# Altium footprint library 3.22-杂项.PcbLib: 985 footprints (part 26 of 64)
Each footprint in its own frame and in the unit in brackets; x right, y up, seen from the top. Pads: shape width x height; smd on the part's side, far side on the other; paste and mask are expansions set on the pad; w line width, h text height; cw(c..) or ccw(c..) is an arc to the next point about the centre after c.
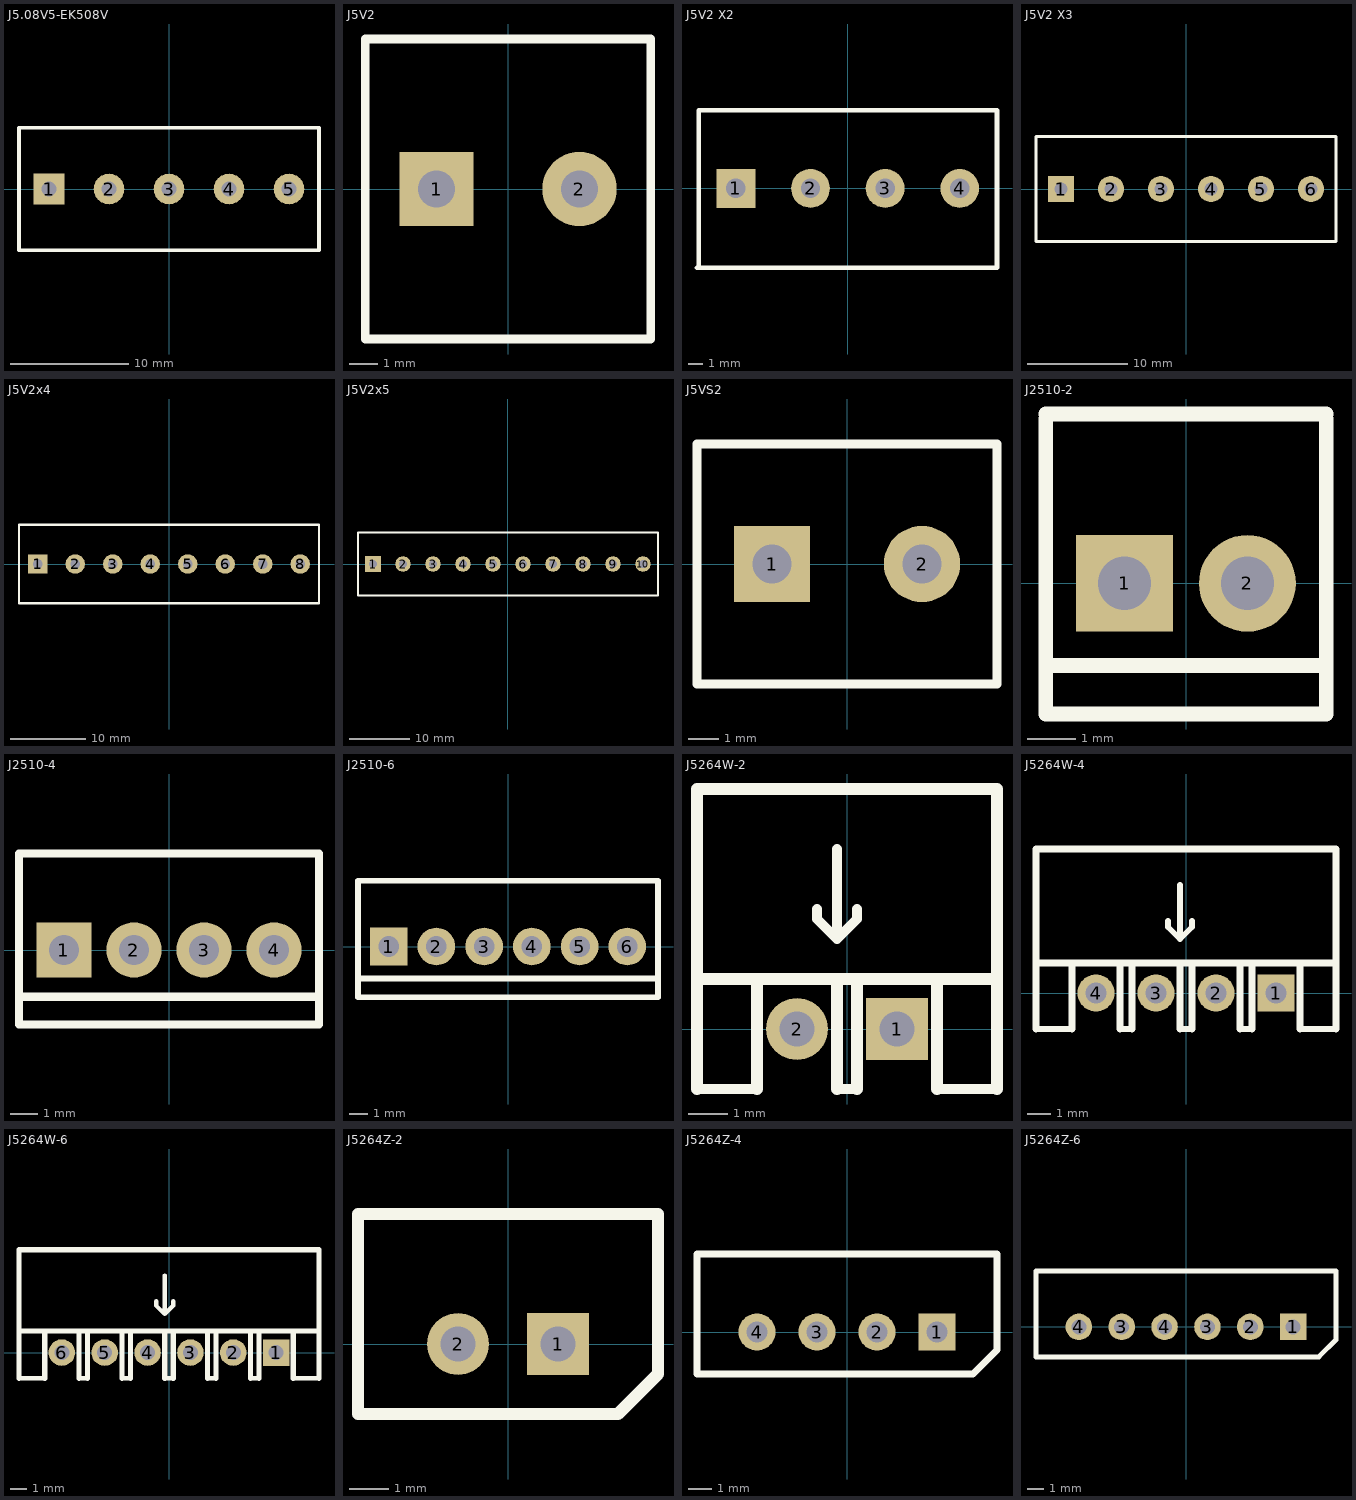
[diagram p25: the footprints below, top view; thin cyan lines are the x and y axes]

## J5.08V5-EK508V [mm] "由2芯和3芯拼接起来的"
pads (5):
  rect 2.6x2.6 hole 1.3: 1(-10.16,0)
  round 2.6 hole 1.3: 2(-5.08,0) 3(0,0) 4(5.08,0) 5(10.16,0)
Top Overlay:
  lines w0.305: -12.7,-5.2 -12.7,5.2 12.7,5.2 12.7,-5.2 -12.7,-5.2

## J5V2 [mm] "5mm间距2芯方针，直径1.3mm，垂直方向一字镙丝,宽10.5mm"
height 14.2
pads (2):
  rect 2.6x2.6 hole 1.3: 1(-2.5,0)
  round 2.6 hole 1.3: 2(2.5,0)
Top Overlay:
  lines w0.305: -5,-5.25 -5,5.25 5,5.25 5,-5.25 -5,-5.25

## J5V2 X2 [mm] "5mm间距2芯方针，直径1.3mm，垂直方向一字镙丝,宽10.5mm"
pads (4):
  rect 2.6x2.6 hole 1.3: 1(-7.5,0)
  round 2.6 hole 1.3: 2(-2.5,0) 3(2.5,0) 4(7.5,0)
Top Overlay:
  lines w0.305: -10.108,-5.334 10,-5.334 ; -10,-5.25 -10,5.25 10,5.25 10,-5.25

## J5V2 X3 [mm] "3个J5V2组成：5mm间距2芯方针，直径1.3mm，垂直方向一字镙丝,宽10.5mm"
pads (6):
  rect 2.6x2.6 hole 1.3: 1(-12.5,0)
  round 2.6 hole 1.3: 2(-7.5,0) 3(-2.5,0) 4(2.5,0) 5(7.5,0) 6(12.5,0)
Top Overlay:
  lines w0.305: -15,-5.25 15,-5.25 15,5.25 -15,5.25 -15,-5.25

## J5V2x4 [mm] "4个J5V2组成：5mm间距2芯方针，直径1.3mm，垂直方向一字镙丝,宽10.5mm"
height 14.2
pads (8):
  rect 2.6x2.6 hole 1.3: 1(-17.5,0)
  round 2.6 hole 1.3: 2(-12.5,0) 3(-7.5,0) 4(-2.5,0) 5(2.5,0) 6(7.5,0) 7(12.5,0) 8(17.5,0)
Top Overlay:
  lines w0.305: -20,-5.25 -20,5.25 20,5.25 20,-5.25 -20,-5.25

## J5V2x5 [mm] "5个J5V2组成：5mm间距2芯方针，直径1.3mm，垂直方向一字镙丝,宽10.5mm"
height 14.2
pads (10):
  rect 2.6x2.6 hole 1.3: 1(-22.5,0)
  round 2.6 hole 1.3: 2(-17.5,0) 3(-12.5,0) 4(-7.5,0) 5(-2.5,0) 6(2.5,0) 7(7.5,0) 8(12.5,0) 9(17.5,0) 10(22.5,0)
Top Overlay:
  lines w0.305: -25,-5.25 25,-5.25 25,5.25 -25,5.25 -25,-5.25

## J5VS2 [mm] "小号5mm间距2芯方针，直径1.3mm，垂直方向十字镙丝,宽8mm"
height 10
pads (2):
  rect 2.54x2.54 hole 1.3: 1(-2.5,0)
  round 2.54 hole 1.3: 2(2.5,0)
Top Overlay:
  lines w0.305: -5,-4 -5,4 5,4 5,-4 -5,-4

## J2510-2 [mm] "后排有靠的25102芯可插拨白插座"
height 16
pads (2):
  rect 2x2 hole 1.1: 1(-1.27,0)
  round 2 hole 1.1: 2(1.27,0)
Top Overlay:
  lines w0.305: -2.9,-1.7 2.9,-1.7 ; -2.9,3.4 -2.9,-2.7 2.9,-2.7 2.9,3.4 ; -2.9,3.5 2.9,3.5

## J2510-4 [mm] "后排有靠的25102芯可插拨白插座"
height 16
pads (4):
  rect 2x2 hole 1.1: 1(-3.81,0)
  round 2 hole 1.1: 2(-1.27,0) 3(1.27,0) 4(3.81,0)
Top Overlay:
  lines w0.305: -5.44,-1.7 5.44,-1.7 ; -5.44,3.4 -5.44,-2.7 5.44,-2.7 5.44,3.4 ; -5.44,3.5 5.44,3.5

## J2510-6 [mm] "后排有靠的25102芯可插拨白插座"
height 16
pads (6):
  rect 2x2 hole 1.1: 1(-6.35,0)
  round 2 hole 1.1: 2(-3.81,0) 3(-1.27,0) 4(1.27,0) 5(3.81,0) 6(6.35,0)
Top Overlay:
  lines w0.305: -7.98,-1.7 7.98,-1.7 ; -7.98,3.4 -7.98,-2.7 7.98,-2.7 7.98,3.4 ; -7.98,3.5 7.98,3.5

## J5264W-2 [mil] "莫来克斯2芯可插拨白插座（弯头）"
height 629.92
pads (2):
  rect 62x62 hole 35: 1(50,0)
  round 62 hole 35: 2(-50,0)
Top Overlay:
  lines w10: -150,-60 -90,-60 ; -30,120 -30,110 -10,90 ; -10,-60 10,-60 ; -10,180 -10,90 ; 10,120 10,110 -10,90 ; 110,-60 90,-60 150,-60
  lines w12: -150,-60 -150,240 150,240 150,-60 ; -150,50 150,50 ; -90,-60 -90,50 ; -10,-60 -10,50 ; 10,-60 10,50 ; 90,-60 90,50

## J5264W-4 [mil] "莫来克斯4芯可插拨白插座（弯头）"
height 629.92
pads (4):
  rect 62x62 hole 35: 1(150,0)
  round 62 hole 35: 2(50,0) 3(-50,0) 4(-150,0)
Top Overlay:
  lines w10: -250,-60 -190,-60 ; -110,-60 -90,-60 ; -30,120 -30,110 -10,90 ; -10,-60 10,-60 ; -10,180 -10,90 ; 10,120 10,110 -10,90 ; 90,-60 110,-60 ; 190,-60 250,-60
  lines w12: -250,-60 -250,240 250,240 250,-60 ; -250,50 250,50 ; -190,-60 -190,50 ; -110,-60 -110,50 ; -90,-60 -90,50 ; -10,-60 -10,50 ; 10,-60 10,50 ; 90,-60 90,50 ; 110,-60 110,50 ; 190,-60 190,50

## J5264W-6 [mil] "莫来克斯6芯可插拨白插座（弯头）"
height 629.92
pads (6):
  rect 62x62 hole 35: 1(250,0)
  round 62 hole 35: 2(150,0) 3(50,0) 4(-50,0) 5(-150,0) 6(-250,0)
Top Overlay:
  lines w10: -350,-60 -290,-60 ; -210,-60 -190,-60 ; -110,-60 -90,-60 ; -30,120 -30,110 -10,90 ; -10,-60 10,-60 ; -10,180 -10,90 ; 10,120 10,110 -10,90 ; 90,-60 110,-60 ; 190,-60 210,-60 ; 290,-60 350,-60
  lines w12: -350,-60 -350,240 350,240 350,-60 ; -350,50 350,50 ; -290,-60 -290,50 ; -210,-60 -210,50 ; -190,-60 -190,50 ; -110,-60 -110,50 ; -90,-60 -90,50 ; -10,-60 -10,50 ; 10,-60 10,50 ; 110,-60 110,50 ; 190,-60 190,50 ; 210,-60 210,50 ; 290,-60 290,50 ; 90,-60 90,50 90,-60

## J5264Z-2 [mil] "莫来克斯2芯可插拨白插座（直头）"
height 629.92
pads (2):
  rect 62x62 hole 35: 1(50,0)
  round 62 hole 35: 2(-50,0)
Top Overlay:
  lines w12: -150,-70 110,-70 150,-30 150,130 -150,130 -150,-70

## J5264Z-4 [mil] "莫来克斯4芯可插拨白插座（直头）"
height 629.92
pads (4):
  rect 62x62 hole 35: 1(150,0)
  round 62 hole 35: 2(50,0) 3(-50,0) 4(-150,0)
Top Overlay:
  lines w12: -250,-70 210,-70 250,-30 250,130 -250,130 -250,-70

## J5264Z-6 [mil] "莫来克斯4芯可插拨白插座（直头）"
height 629.92
pads (6):
  rect 62x62 hole 35: 1(250,0)
  round 62 hole 35: 2(150,0) 3(-150,0) 3(50,0) 4(-250,0) 4(-50,0)
Top Overlay:
  lines w12: -350,-70 -350,130 350,130 350,-30 310,-70 -350,-70